# Altium footprint library iv_footprints.PcbLib: 724 footprints (part 2 of 46)
Each footprint in its own frame and in the unit in brackets; x right, y up, seen from the top. Pads: shape width x height; smd on the part's side, far side on the other; paste and mask are expansions set on the pad; w line width, h text height; cw(c..) or ccw(c..) is an arc to the next point about the centre after c.
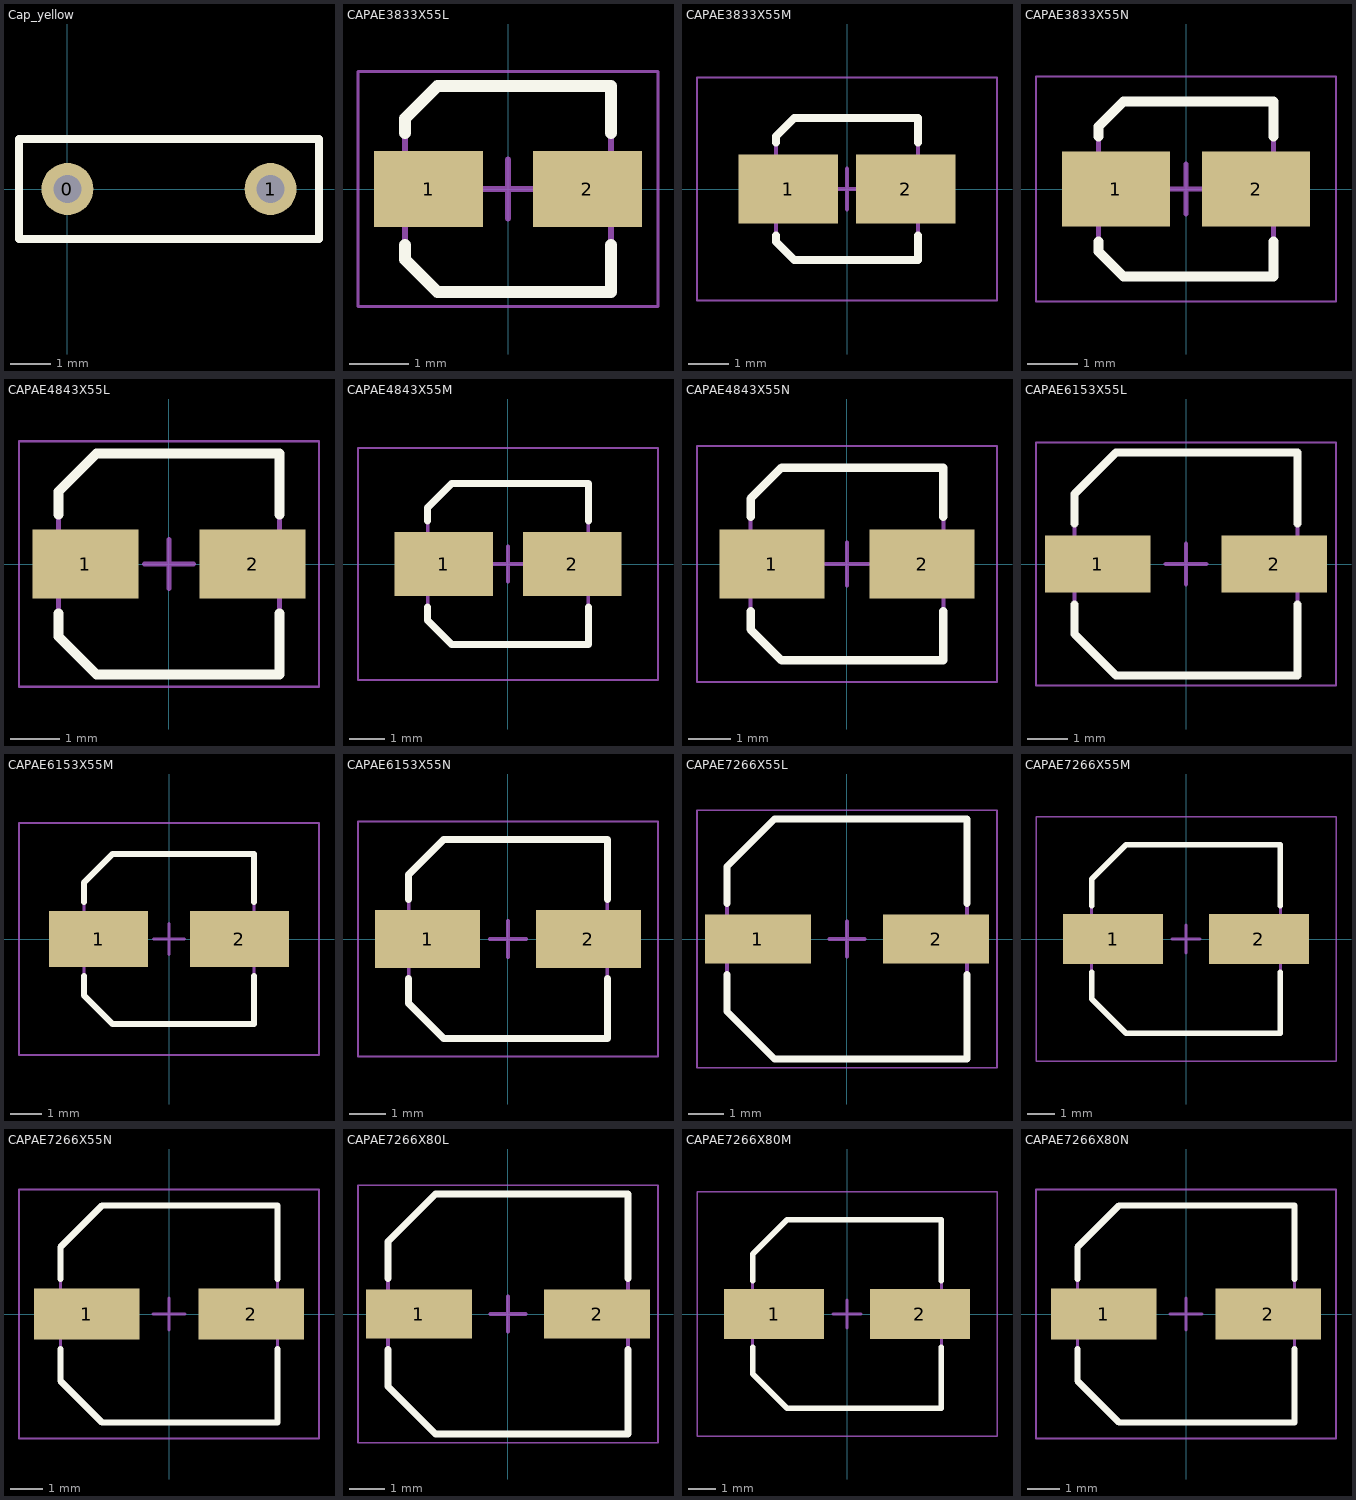
[diagram p1: the footprints below, top view; thin cyan lines are the x and y axes]

## Cap_yellow [mm]
pads (2):
  round 1.3 hole 0.7: 0(0,0) 1(5.08,0)
Top Overlay:
  lines w0.2: -1.21,-1.25 6.29,-1.25 6.29,1.25 -1.21,1.25 -1.21,-1.25
3D body "Cap yellow.stp": height 6.5, standoff -3, extent -1.25,-1.25 6.25,1.25

## CAPAE3833X55L [mm] "Aluminum Electrolytic Capacitor, Body 3,30x3,30x5,50mm, IPC High Density"
height 5.5
pads (2):
  rect 1.85x1.3 smd: 1(-1.35,0) 2(1.35,0)
Top Overlay:
  lines w0.2: -1.75,-0.95 -1.75,-1.2 -1.2,-1.75 1.75,-1.75 1.75,-0.95 ; -1.75,0.95 -1.75,1.2 -1.2,1.75 1.75,1.75 1.75,0.95
Mechanical 13:
  lines w0.1: -1.75,-1.2 -1.75,1.2 -1.2,1.75 1.75,1.75 1.75,-1.75 -1.2,-1.75 -1.75,-1.2
Mechanical 15:
  lines w0.05: -2.55,-2 2.55,-2 2.55,2 -2.55,2 -2.55,-2
  lines w0.1: -0.5,0 0.5,0 ; 0,-0.5 0,0.5
3D body "CAPAE3833X55L.step": height 5.5, standoff 0, extent -1.875,-1.75 1.875,1.75

## CAPAE3833X55M [mm] "Aluminum Electrolytic Capacitor, Body 3,30x3,30x5,50mm, IPC Low Density"
height 5.5
pads (2):
  rect 2.45x1.7 smd: 1(-1.45,0) 2(1.45,0)
Top Overlay:
  lines w0.2: -1.75,-1.15 -1.75,-1.3 -1.3,-1.75 1.75,-1.75 1.75,-1.15 ; -1.75,1.15 -1.75,1.3 -1.3,1.75 1.75,1.75 1.75,1.15
Mechanical 13:
  lines w0.1: -1.75,-1.3 -1.3,-1.75 1.75,-1.75 1.75,1.75 -1.3,1.75 -1.75,1.3 -1.75,-1.3
Mechanical 15:
  lines w0.05: -3.7,-2.75 -3.7,2.75 3.7,2.75 3.7,-2.75 -3.7,-2.75
  lines w0.1: -0.5,0 0.5,0 ; 0,-0.5 0,0.5
3D body "CAPAE3833X55M.step": height 5.5, standoff 0, extent -1.875,-1.75 1.875,1.75

## CAPAE3833X55N [mm] "Aluminum Electrolytic Capacitor, Body 3,30x3,30x5,50mm, IPC Medium Density"
height 5.5
pads (2):
  rect 2.15x1.5 smd: 1(-1.4,0) 2(1.4,0)
Top Overlay:
  lines w0.2: -1.75,-1.05 -1.75,-1.25 -1.25,-1.75 1.75,-1.75 1.75,-1.05 ; -1.75,1.05 -1.75,1.25 -1.25,1.75 1.75,1.75 1.75,1.05
Mechanical 13:
  lines w0.1: -1.75,-1.25 -1.75,1.25 -1.25,1.75 1.75,1.75 1.75,-1.75 -1.25,-1.75 -1.75,-1.25
Mechanical 15:
  lines w0.05: -3,-2.25 3,-2.25 3,2.25 -3,2.25 -3,-2.25
  lines w0.1: -0.5,0 0.5,0 ; 0,-0.5 0,0.5
3D body "CAPAE3833X55N.step": height 5.5, standoff 0, extent -1.875,-1.75 1.875,1.75

## CAPAE4843X55L [mm] "Aluminum Electrolytic Capacitor, Body 4,30x4,30x5,50mm, IPC High Density"
height 5.5
pads (2):
  rect 2.15x1.4 smd: 1(-1.7,0) 2(1.7,0)
Top Overlay:
  lines w0.2: -2.25,-1 -2.25,-1.475 -1.475,-2.25 2.25,-2.25 2.25,-1 ; -2.25,1 -2.25,1.475 -1.475,2.25 2.25,2.25 2.25,1
Mechanical 13:
  lines w0.1: -2.25,-1.475 -2.25,1.475 -1.475,2.25 2.25,2.25 2.25,-2.25 -1.475,-2.25 -2.25,-1.475
Mechanical 15:
  lines w0.05: -3.05,-2.5 3.05,-2.5 3.05,2.5 -3.05,2.5 -3.05,-2.5
  lines w0.1: -0.5,0 0.5,0 ; 0,-0.5 0,0.5
3D body "CAPAE4843X55L.step": height 5.5, standoff 0, extent -2.375,-2.25 2.375,2.25

## CAPAE4843X55M [mm] "Aluminum Electrolytic Capacitor, Body 4,30x4,30x5,50mm, IPC Low Density"
height 5.5
pads (2):
  rect 2.75x1.8 smd: 1(-1.8,0) 2(1.8,0)
Top Overlay:
  lines w0.2: -2.25,-1.2 -2.25,-1.575 -1.575,-2.25 2.25,-2.25 2.25,-1.2 ; -2.25,1.2 -2.25,1.575 -1.575,2.25 2.25,2.25 2.25,1.2
Mechanical 13:
  lines w0.1: -2.25,-1.575 -1.575,-2.25 2.25,-2.25 2.25,2.25 -1.575,2.25 -2.25,1.575 -2.25,-1.575
Mechanical 15:
  lines w0.05: -4.2,-3.25 -4.2,3.25 4.2,3.25 4.2,-3.25 -4.2,-3.25
  lines w0.1: -0.5,0 0.5,0 ; 0,-0.5 0,0.5
3D body "CAPAE4843X55M.step": height 5.5, standoff 0, extent -2.375,-2.25 2.375,2.25

## CAPAE4843X55N [mm] "Aluminum Electrolytic Capacitor, Body 4,30x4,30x5,50mm, IPC Medium Density"
height 5.5
pads (2):
  rect 2.45x1.6 smd: 1(-1.75,0) 2(1.75,0)
Top Overlay:
  lines w0.2: -2.25,-1.1 -2.25,-1.525 -1.525,-2.25 2.25,-2.25 2.25,-1.1 ; -2.25,1.1 -2.25,1.525 -1.525,2.25 2.25,2.25 2.25,1.1
Mechanical 13:
  lines w0.1: -2.25,-1.525 -1.525,-2.25 2.25,-2.25 2.25,2.25 -1.525,2.25 -2.25,1.525 -2.25,-1.525
Mechanical 15:
  lines w0.05: -3.5,-2.75 -3.5,2.75 3.5,2.75 3.5,-2.75 -3.5,-2.75
  lines w0.1: -0.5,0 0.5,0 ; 0,-0.5 0,0.5
3D body "CAPAE4843X55N.step": height 5.5, standoff 0, extent -2.375,-2.25 2.375,2.25

## CAPAE6153X55L [mm] "Aluminum Electrolytic Capacitor, Body 5,30x5,30x5,50mm, IPC High Density"
height 5.5
pads (2):
  rect 2.6x1.4 smd: 1(-2.175,0) 2(2.175,0)
Top Overlay:
  lines w0.2: -2.75,-1 -2.75,-1.725 -1.725,-2.75 2.75,-2.75 2.75,-1 ; -2.75,1 -2.75,1.725 -1.725,2.75 2.75,2.75 2.75,1
Mechanical 13:
  lines w0.1: -2.75,-1.725 -2.75,1.725 -1.725,2.75 2.75,2.75 2.75,-2.75 -1.725,-2.75 -2.75,-1.725
Mechanical 15:
  lines w0.05: -3.7,-3 3.7,-3 3.7,3 -3.7,3 -3.7,-3
  lines w0.1: -0.5,0 0.5,0 ; 0,-0.5 0,0.5
3D body "CAPAE6153X55L.step": height 5.5, standoff 0, extent -3.05,-2.75 3.05,2.75

## CAPAE6153X55M [mm] "Aluminum Electrolytic Capacitor, Body 5,30x5,30x5,50mm, IPC Low Density"
height 5.5
pads (2):
  rect 3.2x1.8 smd: 1(-2.275,0) 2(2.275,0)
Top Overlay:
  lines w0.2: -2.75,-1.2 -2.75,-1.825 -1.825,-2.75 2.75,-2.75 2.75,-1.2 ; -2.75,1.2 -2.75,1.825 -1.825,2.75 2.75,2.75 2.75,1.2
Mechanical 13:
  lines w0.1: -2.75,-1.825 -1.825,-2.75 2.75,-2.75 2.75,2.75 -1.825,2.75 -2.75,1.825 -2.75,-1.825
Mechanical 15:
  lines w0.05: -4.85,-3.75 -4.85,3.75 4.85,3.75 4.85,-3.75 -4.85,-3.75
  lines w0.1: -0.5,0 0.5,0 ; 0,-0.5 0,0.5
3D body "CAPAE6153X55M.step": height 5.5, standoff 0, extent -3.05,-2.75 3.05,2.75

## CAPAE6153X55N [mm] "Aluminum Electrolytic Capacitor, Body 5,30x5,30x5,50mm, IPC Medium Density"
height 5.5
pads (2):
  rect 2.9x1.6 smd: 1(-2.225,0) 2(2.225,0)
Top Overlay:
  lines w0.2: -2.75,-1.1 -2.75,-1.775 -1.775,-2.75 2.75,-2.75 2.75,-1.1 ; -2.75,1.1 -2.75,1.775 -1.775,2.75 2.75,2.75 2.75,1.1
Mechanical 13:
  lines w0.1: -2.75,-1.775 -1.775,-2.75 2.75,-2.75 2.75,2.75 -1.775,2.75 -2.75,1.775 -2.75,-1.775
Mechanical 15:
  lines w0.05: -4.15,-3.25 -4.15,3.25 4.15,3.25 4.15,-3.25 -4.15,-3.25
  lines w0.1: -0.5,0 0.5,0 ; 0,-0.5 0,0.5
3D body "CAPAE6153X55N.step": height 5.5, standoff 0, extent -3.05,-2.75 3.05,2.75

## CAPAE7266X55L [mm] "Aluminum Electrolytic Capacitor, Body 6,60x6,60x5,50mm, IPC High Density"
height 5.5
pads (2):
  rect 3x1.4 smd: 1(-2.525,0) 2(2.525,0)
Top Overlay:
  lines w0.2: -3.4,-1 -3.4,-2.05 -2.05,-3.4 3.4,-3.4 3.4,-1 ; -3.4,1 -3.4,2.05 -2.05,3.4 3.4,3.4 3.4,1
Mechanical 13:
  lines w0.1: -3.4,-2.05 -2.05,-3.4 3.4,-3.4 3.4,3.4 -2.05,3.4 -3.4,2.05 -3.4,-2.05
Mechanical 15:
  lines w0.05: -4.25,-3.65 -4.25,3.65 4.25,3.65 4.25,-3.65 -4.25,-3.65
  lines w0.1: -0.5,0 0.5,0 ; 0,-0.5 0,0.5
3D body "CAPAE7266X55L.step": height 5.5, standoff -0.8, extent -3.6,-3.4 3.6,3.4

## CAPAE7266X55M [mm] "Aluminum Electrolytic Capacitor, Body 6,60x6,60x5,50mm, IPC Low Density"
height 5.5
pads (2):
  rect 3.6x1.8 smd: 1(-2.625,0) 2(2.625,0)
Top Overlay:
  lines w0.2: -3.4,-1.2 -3.4,-2.15 -2.15,-3.4 3.4,-3.4 3.4,-1.2 ; -3.4,1.2 -3.4,2.15 -2.15,3.4 3.4,3.4 3.4,1.2
Mechanical 13:
  lines w0.1: -3.4,-2.15 -2.15,-3.4 3.4,-3.4 3.4,3.4 -2.15,3.4 -3.4,2.15 -3.4,-2.15
Mechanical 15:
  lines w0.05: -5.4,-4.4 -5.4,4.4 5.4,4.4 5.4,-4.4 -5.4,-4.4
  lines w0.1: -0.5,0 0.5,0 ; 0,-0.5 0,0.5
3D body "CAPAE7266X55M.step": height 5.5, standoff -0.8, extent -3.6,-3.4 3.6,3.4

## CAPAE7266X55N [mm] "Aluminum Electrolytic Capacitor, Body 6,60x6,60x5,50mm, IPC Medium Density"
height 5.5
pads (2):
  rect 3.3x1.6 smd: 1(-2.575,0) 2(2.575,0)
Top Overlay:
  lines w0.2: -3.4,-1.1 -3.4,-2.1 -2.1,-3.4 3.4,-3.4 3.4,-1.1 ; -3.4,1.1 -3.4,2.1 -2.1,3.4 3.4,3.4 3.4,1.1
Mechanical 13:
  lines w0.1: -3.4,-2.1 -3.4,2.1 -2.1,3.4 3.4,3.4 3.4,-3.4 -2.1,-3.4 -3.4,-2.1
Mechanical 15:
  lines w0.05: -4.7,-3.9 4.7,-3.9 4.7,3.9 -4.7,3.9 -4.7,-3.9
  lines w0.1: -0.5,0 0.5,0 ; 0,-0.5 0,0.5
3D body "CAPAE7266X55N.step": height 5.5, standoff -0.8, extent -3.6,-3.4 3.6,3.4

## CAPAE7266X80L [mm] "Aluminum Electrolytic Capacitor, Body 6,60x6,60x8,00mm, IPC High Density"
height 8
pads (2):
  rect 3x1.4 smd: 1(-2.525,0) 2(2.525,0)
Top Overlay:
  lines w0.2: -3.4,-1 -3.4,-2.05 -2.05,-3.4 3.4,-3.4 3.4,-1 ; -3.4,1 -3.4,2.05 -2.05,3.4 3.4,3.4 3.4,1
Mechanical 13:
  lines w0.1: -3.4,-2.05 -3.4,2.05 -2.05,3.4 3.4,3.4 3.4,-3.4 -2.05,-3.4 -3.4,-2.05
Mechanical 15:
  lines w0.05: -4.25,-3.65 4.25,-3.65 4.25,3.65 -4.25,3.65 -4.25,-3.65
  lines w0.1: -0.5,0 0.5,0 ; 0,-0.5 0,0.5
3D body "CAPAE7266X80L.step": height 8, standoff 0, extent -3.6,-3.4 3.6,3.4

## CAPAE7266X80M [mm] "Aluminum Electrolytic Capacitor, Body 6,60x6,60x8,00mm, IPC Low Density"
height 8
pads (2):
  rect 3.6x1.8 smd: 1(-2.625,0) 2(2.625,0)
Top Overlay:
  lines w0.2: -3.4,-1.2 -3.4,-2.15 -2.15,-3.4 3.4,-3.4 3.4,-1.2 ; -3.4,1.2 -3.4,2.15 -2.15,3.4 3.4,3.4 3.4,1.2
Mechanical 13:
  lines w0.1: -3.4,-2.15 -3.4,2.15 -2.15,3.4 3.4,3.4 3.4,-3.4 -2.15,-3.4 -3.4,-2.15
Mechanical 15:
  lines w0.05: -5.4,-4.4 5.4,-4.4 5.4,4.4 -5.4,4.4 -5.4,-4.4
  lines w0.1: -0.5,0 0.5,0 ; 0,-0.5 0,0.5
3D body "CAPAE7266X80M.step": height 8, standoff 0, extent -3.6,-3.4 3.6,3.4

## CAPAE7266X80N [mm] "Aluminum Electrolytic Capacitor, Body 6,60x6,60x8,00mm, IPC Medium Density"
height 8
pads (2):
  rect 3.3x1.6 smd: 1(-2.575,0) 2(2.575,0)
Top Overlay:
  lines w0.2: -3.4,-1.1 -3.4,-2.1 -2.1,-3.4 3.4,-3.4 3.4,-1.1 ; -3.4,1.1 -3.4,2.1 -2.1,3.4 3.4,3.4 3.4,1.1
Mechanical 13:
  lines w0.1: -3.4,-2.1 -3.4,2.1 -2.1,3.4 3.4,3.4 3.4,-3.4 -2.1,-3.4 -3.4,-2.1
Mechanical 15:
  lines w0.05: -4.7,-3.9 4.7,-3.9 4.7,3.9 -4.7,3.9 -4.7,-3.9
  lines w0.1: -0.5,0 0.5,0 ; 0,-0.5 0,0.5
3D body "CAPAE7266X80N.step": height 8, standoff 0, extent -3.6,-3.4 3.6,3.4